# Altium footprint library LC-Standard-FootPrints-AD-V1.00工程师同事给的标准库（含3D）.PcbLib: 463 footprints (part 1 of 29)
Each footprint in its own frame and in the unit in brackets; x right, y up, seen from the top. Pads: shape width x height; smd on the part's side, far side on the other; paste and mask are expansions set on the pad; w line width, h text height; cw(c..) or ccw(c..) is an arc to the next point about the centre after c.
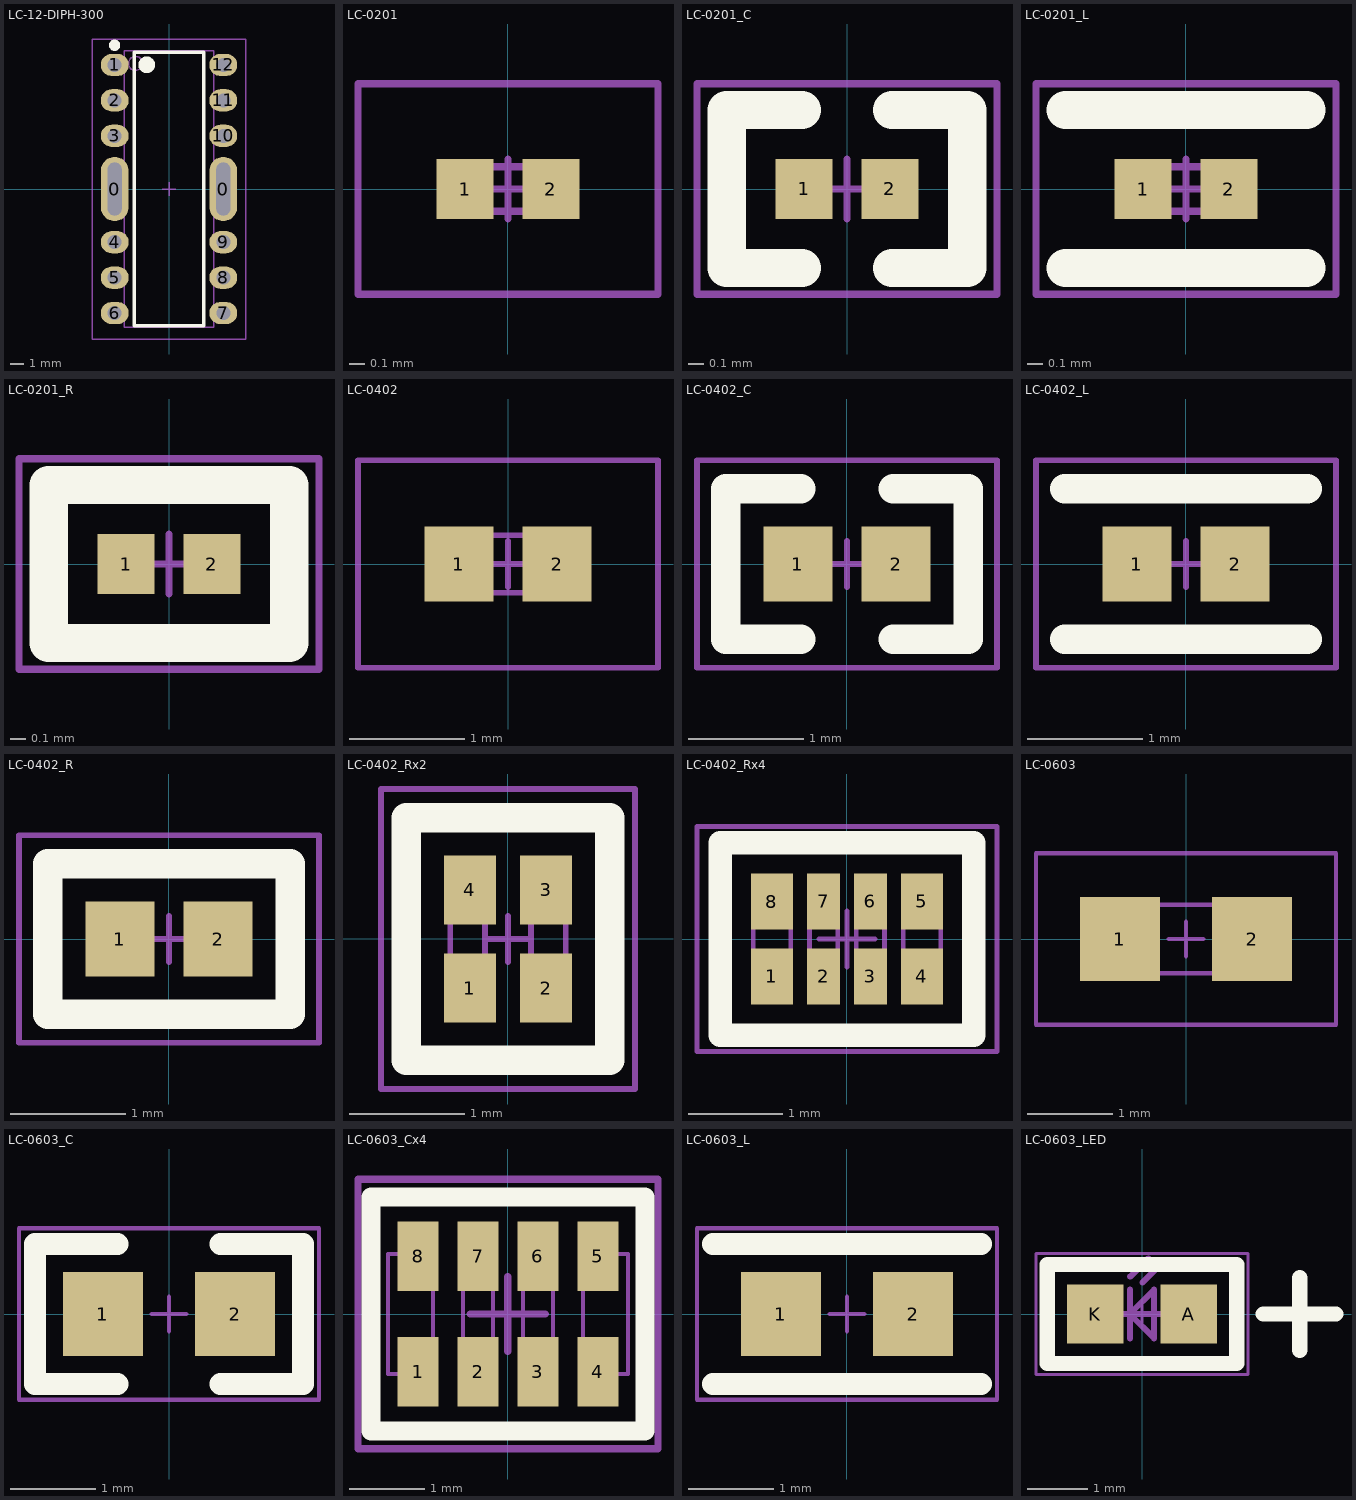
[diagram p0: the footprints below, top view; thin cyan lines are the x and y axes]

## LC-12-DIPH-300 [mm]
pads (14):
  oval 2x4.6 hole 1 slot 3.8 at 90 deg: 0(-3.89,0) 0(3.89,0)
  oval 2x1.6 hole 1: 1(-3.89,8.89) 2(-3.89,6.35) 3(-3.89,3.81) 4(-3.89,-3.81) 5(-3.89,-6.35) 6(-3.89,-8.89) 7(3.89,-8.89) 8(3.89,-6.35) 9(3.89,-3.81) 10(3.89,3.81) 11(3.89,6.35) 12(3.89,8.89)
Top Overlay:
  circle w0.4: c-3.9,10.3 r0.2
  circle w0.6: c-1.6,8.9 r0.3
  lines w0.254: -2.5,-9.8 2.5,-9.8 2.5,9.8 -2.5,9.8 -2.5,-9.8
Mechanical 13:
  circle w0.1: c-2.4,9 r0.5
  lines w0.1: -3.2,-9.9 -3.2,9.9 3.2,9.9 3.2,-9.9 -3.2,-9.9
Mechanical 15:
  lines w0.1: -0.5,0 0.5,0 ; 0,-0.5 0,0.5 ; -5.5,-10.75 -5.5,10.75 5.5,10.75 5.5,-10.75 -5.5,-10.75

## LC-0201 [mm]
pads (2):
  rect 0.38x0.4 smd mask+0.051: 1(-0.285,0) 2(0.285,0)
Mechanical 13:
  lines w0.05: -0.3,-0.15 -0.3,0.15 0.3,0.15 0.3,-0.15 -0.3,-0.15
Mechanical 15:
  lines w0.05: -0.2,0 0.2,0 ; 0,-0.2 0,0.2 ; -1,-0.7 -1,0.7 1,0.7 1,-0.7 -1,-0.7

## LC-0201_C [mm]
pads (2):
  rect 0.38x0.4 smd mask+0.051: 1(-0.285,0) 2(0.285,0)
Top Overlay:
  lines w0.254: -0.3,-0.527 -0.802,-0.527 -0.802,0.527 -0.3,0.527 ; 0.3,-0.527 0.802,-0.527 0.802,0.527 0.3,0.527
Mechanical 15:
  lines w0.05: -0.2,0 0.2,0 ; 0,-0.2 0,0.2 ; -1,-0.7 1,-0.7 1,0.7 -1,0.7 -1,-0.7
3D body: height 0.34, standoff 0, extent -0.34,-0.165 0.34,0.165

## LC-0201_L [mm]
pads (2):
  rect 0.38x0.4 smd mask+0.051: 1(-0.285,0) 2(0.285,0)
Top Overlay:
  lines w0.254: -0.802,-0.527 0.802,-0.527 ; -0.802,0.527 0.802,0.527
Mechanical 13:
  lines w0.05: -0.3,-0.15 0.3,-0.15 0.3,0.15 -0.3,0.15 -0.3,-0.15
Mechanical 15:
  lines w0.05: -0.2,0 0.2,0 ; 0,-0.2 0,0.2 ; -1,-0.7 1,-0.7 1,0.7 -1,0.7 -1,-0.7

## LC-0201_R [mm]
pads (2):
  rect 0.38x0.4 smd mask+0.051: 1(-0.285,0) 2(0.285,0)
Top Overlay:
  lines w0.254: -0.802,-0.527 -0.802,0.527 0.802,0.527 0.802,-0.527 -0.802,-0.527
Mechanical 15:
  lines w0.05: -0.2,0 0.2,0 ; 0,-0.2 0,0.2 ; -1,-0.7 1,-0.7 1,0.7 -1,0.7 -1,-0.7
3D body: height 0.34, standoff 0, extent -0.34,-0.165 0.34,0.165

## LC-0402 [mm]
pads (2):
  rect 0.6x0.65 smd: 1(-0.425,0) 2(0.425,0)
Mechanical 13:
  lines w0.05: -0.5,-0.25 -0.5,0.25 0.5,0.25 0.5,-0.25 -0.5,-0.25
Mechanical 15:
  lines w0.05: -0.2,0 0.2,0 ; 0,-0.2 0,0.2 ; -1.3,-0.9 -1.3,0.9 1.3,0.9 1.3,-0.9 -1.3,-0.9

## LC-0402_C [mm]
pads (2):
  rect 0.6x0.65 smd: 1(-0.425,0) 2(0.425,0)
Top Overlay:
  lines w0.254: -0.4,-0.652 -1.052,-0.652 -1.052,0.652 -0.4,0.652 ; 0.4,-0.652 1.052,-0.652 1.052,0.652 0.4,0.652
Mechanical 15:
  lines w0.05: -0.2,0 0.2,0 ; 0,-0.2 0,0.2 ; -1.3,-0.9 -1.3,0.9 1.3,0.9 1.3,-0.9 -1.3,-0.9
3D body: height 0.2, standoff 0, extent -0.483,-0.3 0.518,0.3

## LC-0402_L [mm]
pads (2):
  rect 0.6x0.65 smd: 1(-0.425,0) 2(0.425,0)
Top Overlay:
  lines w0.254: -1.052,-0.652 1.052,-0.652 ; -1.052,0.652 1.052,0.652
Mechanical 15:
  lines w0.05: -0.2,0 0.2,0 ; 0,-0.2 0,0.2 ; -1.3,-0.9 1.3,-0.9 1.3,0.9 -1.3,0.9 -1.3,-0.9
3D body: height 0.36, standoff -0.01, extent -0.512,-0.262 0.538,0.263

## LC-0402_R [mm]
pads (2):
  rect 0.6x0.65 smd: 1(-0.425,0) 2(0.425,0)
Top Overlay:
  lines w0.254: -1.052,-0.652 -1.052,0.652 1.052,0.652 1.052,-0.652 -1.052,-0.652
Mechanical 15:
  lines w0.05: -0.2,0 0.2,0 ; 0,-0.2 0,0.2 ; -1.3,-0.9 -1.3,0.9 1.3,0.9 1.3,-0.9 -1.3,-0.9
3D body: height 0.41, standoff 0, extent -0.575,-0.275 0.575,0.275

## LC-0402_Rx2 [mm]
pads (4):
  rect 0.45x0.6 smd mask+0.051: 1(-0.33,-0.425) 2(0.33,-0.425) 3(0.33,0.425) 4(-0.33,0.425)
Top Overlay:
  lines w0.254: -0.882,-1.052 -0.882,1.052 0.882,1.052 0.882,-1.052 -0.882,-1.052
Mechanical 13:
  lines w0.05: -0.5,-0.5 -0.2,-0.5 -0.2,0.5 -0.5,0.5 -0.5,-0.5 ; 0.2,-0.5 0.5,-0.5 0.5,0.5 0.2,0.5 0.2,-0.5
Mechanical 15:
  lines w0.05: -0.2,0 0.2,0 ; 0,-0.2 0,0.2 ; -1.1,-1.3 -1.1,1.3 1.1,1.3 1.1,-1.3 -1.1,-1.3
3D body: height 0.35, standoff 0, extent -0.5,-0.5 0.5,0.5

## LC-0402_Rx4 [mm]
pads (9):
  rect 0.45x0.6 smd mask+0.051: 1(-0.8,-0.4) 4(0.8,-0.4) 5(0.8,0.4) 8(-0.8,0.4)
  rect 0.35x0.6 smd mask+0.051: 2(-0.25,-0.4) 3(0.25,-0.4) 6(0.25,0.4) 7(-0.25,0.4)
  rect 0.45x0 smd mask+0.051: 8(-0.8,0.4)
Top Overlay:
  lines w0.254: -1.352,-1.027 1.352,-1.027 1.352,1.027 -1.352,1.027 -1.352,-1.027
Mechanical 13:
  lines w0.05: -1,-0.5 -1,0.5 -0.6,0.5 -0.6,-0.5 -1,-0.5 ; -0.4,-0.5 -0.4,0.5 -0.1,0.5 -0.1,-0.5 -0.4,-0.5 ; 0.1,-0.5 0.1,0.5 0.4,0.5 0.4,-0.5 0.1,-0.5 ; 0.6,-0.5 0.6,0.5 1,0.5 1,-0.5 0.6,-0.5
Mechanical 15:
  lines w0.05: -0.3,0 0.3,0 ; 0,-0.3 0,0.3 ; -1.6,-1.2 -1.6,1.2 1.6,1.2 1.6,-1.2 -1.6,-1.2
3D body: height 0.45, standoff 0, extent -1,-0.5 1,0.5

## LC-0603 [mm]
pads (2):
  rect 0.93x0.98 smd: 1(-0.77,0) 2(0.77,0)
Mechanical 13:
  lines w0.05: -0.8,-0.4 0.8,-0.4 0.8,0.4 -0.8,0.4 -0.8,-0.4
Mechanical 15:
  lines w0.05: -0.2,0 0.2,0 ; 0,-0.2 0,0.2 ; -1.75,-1 -1.75,1 1.75,1 1.75,-1 -1.75,-1

## LC-0603_C [mm]
pads (2):
  rect 0.93x0.98 smd: 1(-0.77,0) 2(0.77,0)
Top Overlay:
  lines w0.254: -0.6,-0.817 -1.562,-0.817 -1.562,0.817 -0.6,0.817 ; 0.6,-0.817 1.562,-0.817 1.562,0.817 0.6,0.817
Mechanical 15:
  lines w0.05: -0.2,0 0.2,0 ; 0,-0.2 0,0.2 ; -1.75,-1 1.75,-1 1.75,1 -1.75,1 -1.75,-1
3D body: height 0.3, standoff 0, extent -0.8,-0.4 0.8,0.4

## LC-0603_Cx4 [mm]
pads (8):
  rect 0.55x0.93 smd: 1(-1.2,-0.77) 2(-0.4,-0.77) 3(0.4,-0.77) 4(1.2,-0.77) 5(1.2,0.77) 6(0.4,0.77) 7(-0.4,0.77) 8(-1.2,0.77)
Top Overlay:
  lines w0.254: -1.827,-1.562 -1.827,1.562 1.827,1.562 1.827,-1.562 -1.827,-1.562
Mechanical 13:
  lines w0.05: -1.6,-0.8 -1.6,0.8 -1,0.8 -1,-0.8 -1.6,-0.8 ; -0.6,-0.8 -0.6,0.8 -0.2,0.8 -0.2,-0.8 -0.6,-0.8 ; 0.2,-0.8 0.2,0.8 0.6,0.8 0.6,-0.8 0.2,-0.8 ; 1,-0.8 1,0.8 1.6,0.8 1.6,-0.8 1,-0.8
Mechanical 15:
  lines w0.1: -0.5,0 0.5,0 ; 0,-0.5 0,0.5 ; -2,-1.8 2,-1.8 2,1.8 -2,1.8 -2,-1.8

## LC-0603_L [mm]
pads (2):
  rect 0.93x0.98 smd: 1(-0.77,0) 2(0.77,0)
Top Overlay:
  lines w0.254: -1.562,-0.817 1.562,-0.817 ; -1.562,0.817 1.562,0.817
Mechanical 15:
  lines w0.05: -0.2,0 0.2,0 ; 0,-0.2 0,0.2 ; -1.75,-1 1.75,-1 1.75,1 -1.75,1 -1.75,-1
3D body: height 0.46, standoff -0.01, extent -0.825,-0.412 0.825,0.413

## LC-0603_LED [mm]
pads (2):
  rect 0.93x0.98 smd: A(0.77,0) K(-0.77,0)
Top Overlay:
  lines w0.254: 2,0 3.2,0 ; 2.6,-0.6 2.6,0.6 ; -1.562,-0.817 -1.562,0.817 1.562,0.817 1.562,-0.817 -1.562,-0.817
Mechanical 13:
  lines w0.1: -0.4,0 0.4,0 ; -0.2,-0.4 -0.2,0.4 ; -0.195,0.617 0.105,0.917 ; 0.005,0.517 0.305,0.817 ; -0.2,0 0.2,0.4 0.2,-0.4 -0.2,0
Mechanical 15:
  lines w0.05: -0.2,0 0.2,0 ; 0,-0.2 0,0.2 ; -1.75,-1 -1.75,1 1.75,1 1.75,-1 -1.75,-1
3D body: height 0.6, standoff 0, extent -0.8,-0.4 0.8,0.4